# Altium footprint library 元件1.PcbLib: 420 footprints (part 22 of 27)
Each footprint in its own frame and in the unit in brackets; x right, y up, seen from the top. Pads: shape width x height; smd on the part's side, far side on the other; paste and mask are expansions set on the pad; w line width, h text height; cw(c..) or ccw(c..) is an arc to the next point about the centre after c.
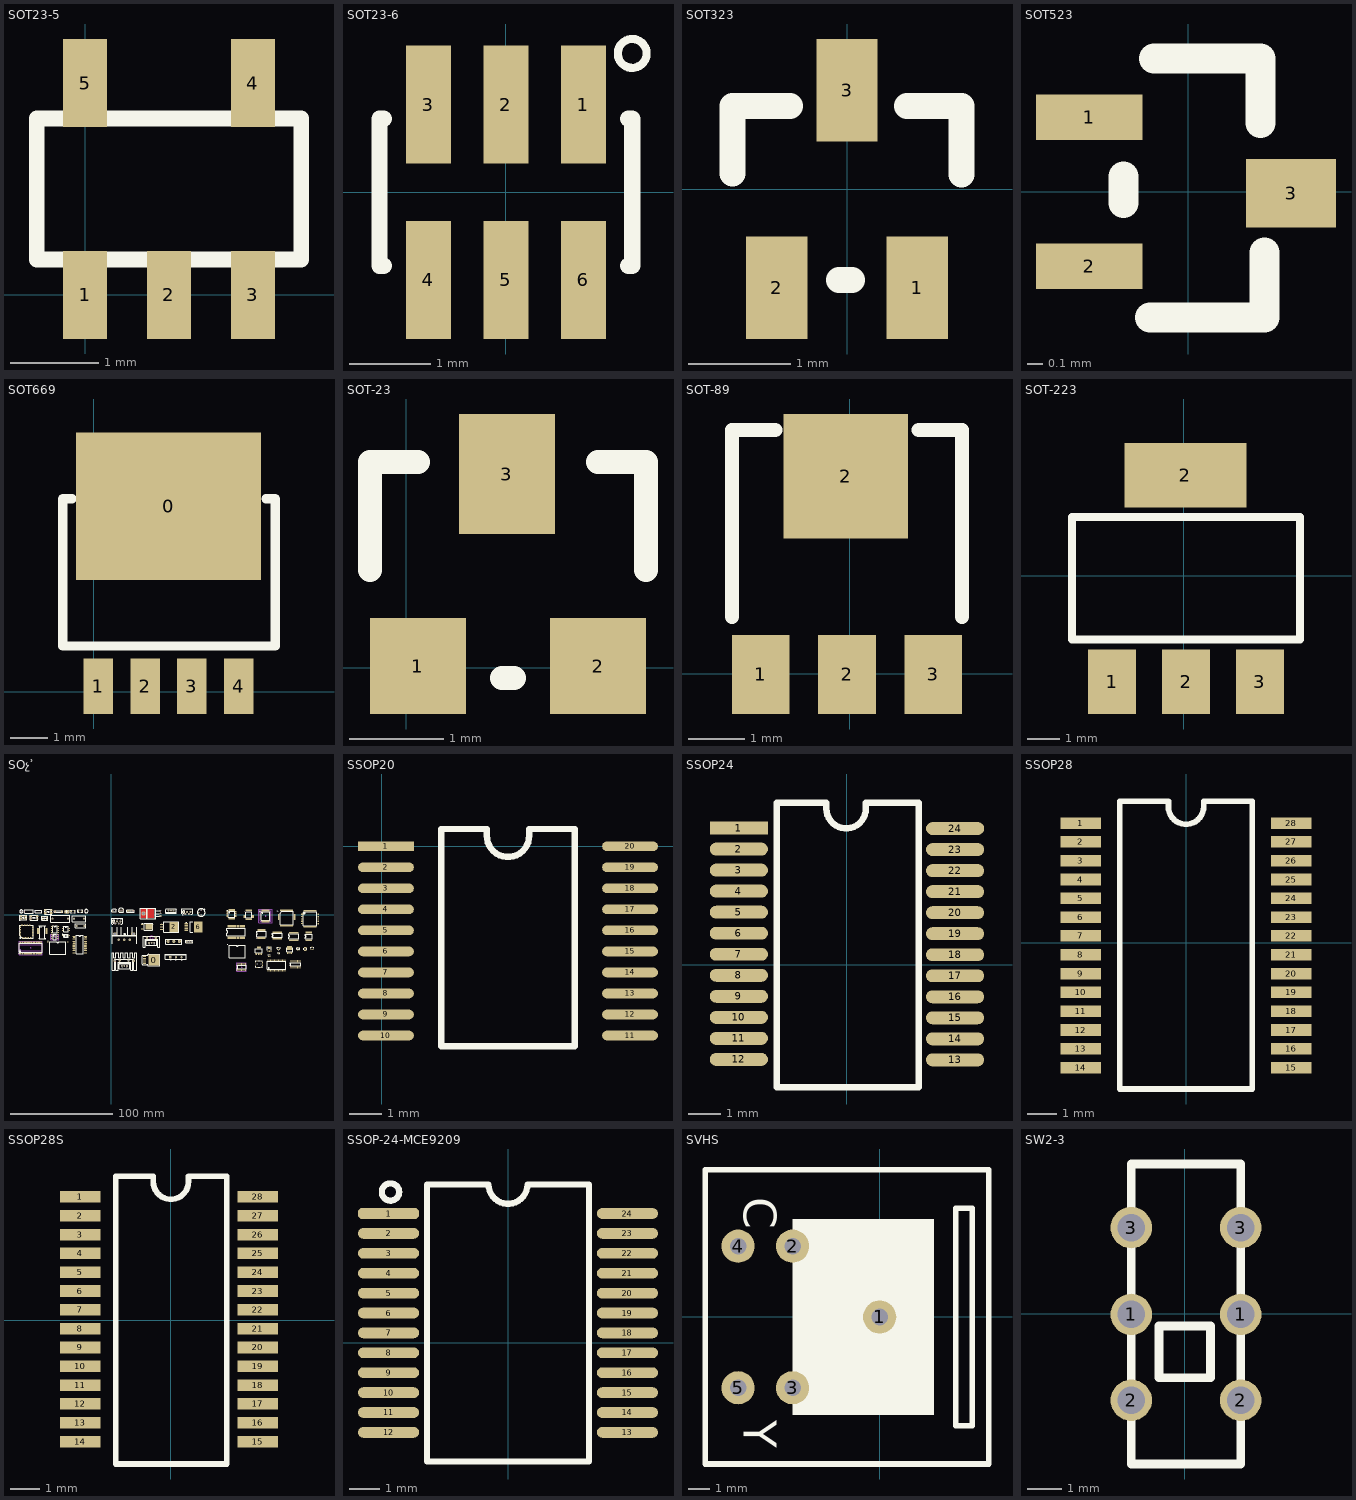
[diagram p21: the footprints below, top view; thin cyan lines are the x and y axes]

## SOT23-5 [mm]
pads (5):
  rect 0.5x1 smd: 1(0,0) 2(0.95,0) 3(1.9,0) 4(1.9,2.4) 5(0,2.4)
Top Overlay:
  lines w0.178: -0.55,0.4 -0.55,2 2.45,2 2.45,0.4 -0.55,0.4
3D body "User Library-SOT23-5.STEP": height 1.09, standoff -0.01, extent -0.5,-0.201 2.399,2.599

## SOT23-6 [mm] "SOT-23/SC-74A; 5 Leads; Body 3.1 x 3 mm, inc. leads (LxW max)"
height 1.45
pads (6):
  rect 0.55x1.45 smd: 1(0.95,1.075) 2(0,1.075) 3(-0.95,1.075) 4(-0.95,-1.075) 5(0,-1.075) 6(0.95,-1.075)
Top Overlay:
  circle w0.1: c1.549,1.702 r0.177
  lines w0.2: -1.5,-0.9 -1.55,-0.9 -1.55,0.9 -1.5,0.9 ; 1.5,-0.9 1.55,-0.9 1.55,0.9 1.5,0.9
3D body "User Library-SOT-23-6.STEP": height 1.08, standoff -0.01, extent -1.397,-1.194 1.397,1.232

## SOT323 [mm]
pads (3):
  rect 0.6x1 smd: 1(0.686,-0.965) 2(-0.686,-0.965) 3(0,0.965)
Top Overlay:
  lines w0.254: -1.118,0.152 -1.118,0.813 -0.559,0.813 ; -0.076,-0.889 0.051,-0.889 ; 0.584,0.813 1.118,0.813 1.118,0.143
3D body "SOT323 (SC70-3)-1.STEP": height 1.1, standoff 0, extent -1.092,-1.097 1.108,1.148

## SOT523 [mil]
pads (3):
  rect 28x12 smd: 1(-25.98,19.58) 2(-25.98,-19.58)
  rect 23.62x18 smd: 3(26.98,-0.46)
Top Overlay:
  lines w7.87: -17,-3 -17,4 ; -10,-33 20,-33 20,-16 ; -9,35 19,35 19,18
3D body "SOT-523.step": height 31.5, standoff 0, extent -32.5,-31.49 30.49,31.5

## SOT669 [mm] "IFPAK"
pads (5):
  rect 5x4 smd: 0(2.032,5.029)
  rect 0.8x1.5 smd: 1(0.127,0.152) 2(1.397,0.152) 3(2.667,0.152) 4(3.937,0.152)
Top Overlay:
  lines w0.254: -0.584,5.232 -0.838,5.232 -0.838,1.245 4.928,1.245 4.928,5.232 4.674,5.232
3D body "User Library-SOT669-CW.step": height 1.55, standoff 0.35, extent -0.418,-0.002 4.482,6.426

## SOT-23 [mil]
pads (3):
  rect 40x40 smd: 1(4.88,0.63) 2(79.88,0.63)
  rect 40x50 smd: 3(41.88,80.63)
Top Overlay:
  lines w10: -15.12,40.63 -15.12,85.63 4.88,85.63 ; 39.88,-4.37 44.88,-4.37 ; 79.88,85.63 99.88,85.63 99.88,40.63
3D body "SOT-23-3.STEP": height 47.24, standoff 0, extent -14.87,-11.02 99.3,99.22

## SOT-89 [mil]
pads (4):
  rect 40x55 smd: 1(-61.82,-0.57) 2(-1.82,-0.57) 3(58.18,-0.57)
  rect 86.61x86.61 smd: 2(-2.76,137.22)
Top Overlay:
  lines w10: -81.82,39.43 -81.82,169.43 -51.82,169.43 ; 48.18,169.43 78.18,169.43 78.18,39.43
3D body "SOT-89.STEP": height 59.45, standoff 0, extent -90.07,-6.45 87.1,162.85

## SOT-223 [mil]
pads (4):
  rect 59x79 smd: 1(-88,-130) 2(2.55,-130) 3(93.1,-130)
  rect 150x79 smd: 2(1.88,123.54)
Top Overlay:
  lines w10: -137.45,-78 142.55,-78 142.55,72 -137.45,72 -137.45,-78
3D body "SOT-223_MP04A.STEP": height 66.93, standoff 0, extent -126.41,-138.72 129.5,135.3

## SOչʾ [mm]
pads (1058):
  round 2.286 hole 1.524: 0(8.179,-44.577) 0(16.815,-44.577) 4(34.696,-22.174) 5(43.332,-22.174)
  rrect10% 11x10.8 smd: 0(41.682,-43.993)
  rect 5x4 smd: 0(173.507,-32.233)
  round 0.508 smd: 0(177.724,3.937) 1(163.525,-10.185)
  oval 0.5x1.45 smd: 1(-88.734,-37.68) 2(-87.934,-37.68) 3(-87.134,-37.68) 4(-86.334,-37.68) 5(-85.534,-37.68) 6(-84.734,-37.68) 7(-83.934,-37.68) 8(-83.134,-37.68) 9(-82.334,-37.68) 10(-81.534,-37.68) 11(-80.734,-37.68) 12(-79.934,-37.68) 13(-79.134,-37.68) 14(-78.334,-37.68) 15(-77.534,-37.68) 16(-76.734,-37.68) 17(-75.934,-37.68) 18(-75.134,-37.68) 19(-74.334,-37.68) 20(-73.534,-37.68) 21(-72.734,-37.68) 22(-71.934,-37.68) 23(-71.134,-37.68) 24(-70.334,-37.68) 25(-69.534,-37.68) 26(-68.734,-37.68) 27(-67.934,-37.68) 28(-67.934,-26.43) 29(-68.734,-26.43) 30(-69.534,-26.43) 31(-70.334,-26.43) 32(-71.134,-26.43) 33(-71.934,-26.43) 34(-72.734,-26.43) 35(-73.534,-26.43) 36(-74.334,-26.43) 37(-75.134,-26.43) 38(-75.934,-26.43) 39(-76.734,-26.43) 40(-77.534,-26.43) 41(-78.334,-26.43) 42(-79.134,-26.43) 43(-79.934,-26.43) 44(-80.734,-26.43) 45(-81.534,-26.43) 46(-82.334,-26.43) 47(-83.134,-26.43) 48(-83.934,-26.43) 49(-84.734,-26.43) 50(-85.534,-26.43) 51(-86.334,-26.43) 52(-87.134,-26.43) 53(-87.934,-26.43) 54(-88.734,-26.43)
  round 1.016 hole 0.635: 1(-88.214,3.302) 2(-86.868,3.302)
  rect 1.9x1.4 smd: 1(-87.847,-3.892) 2(-83.247,-3.892) 3(-83.247,-1.492) 4(-87.847,-1.492)
  rect 1.52x1.52 smd: 1(-85.928,-22.352) 2(-83.388,-22.352) 3(-80.848,-22.352) 4(-78.308,-22.352) 5(-76.352,-19.679) 6(-76.378,-17.139) 7(-76.378,-14.599) 8(-76.352,-12.059) 9(-79.172,-10.135) 10(-81.712,-10.135) 11(-84.252,-10.135) 12(-86.792,-10.135) 13(-88.57,-12.065) 14(-88.57,-14.605) 15(-88.57,-17.145) 16(-88.57,-19.685)
  round 0.8 hole 0.5: 1(-84.785,2.54) 1(-74.473,2.591) 2(-84.785,3.937) 2(-74.473,3.988)
  rect 2.2x1.4 smd: 1(-78.309,-3.993) 2(-72.009,-3.993) 3(-72.009,-1.493) 4(-78.309,-1.493)
  oval 2.25x0.3 smd: 1(-71.004,-11.192) 2(-71.004,-11.692) 3(-71.004,-12.192) 4(-71.004,-12.692) 5(-71.004,-13.192) 6(-71.004,-13.692) 7(-71.004,-14.192) 8(-71.004,-14.692) 9(-71.004,-15.192) 10(-71.004,-15.692) 11(-71.004,-16.192) 12(-71.004,-16.692) 13(-71.004,-17.192) 14(-71.004,-17.692) 15(-71.004,-18.192) 16(-71.004,-18.692) 17(-71.004,-19.192) 18(-71.004,-19.692) 19(-71.004,-20.192) 20(-71.004,-20.692) 21(-71.004,-21.192) 22(-71.004,-21.692) 23(-71.004,-22.192) 24(-71.004,-22.692) 25(-62.904,-22.692) 26(-62.904,-22.192) 27(-62.904,-21.692) 28(-62.904,-21.192) 29(-62.904,-20.692) 30(-62.904,-20.192) 31(-62.904,-19.692) 32(-62.904,-19.192) 33(-62.904,-18.692) 34(-62.904,-18.192) 35(-62.904,-17.692) 36(-62.904,-17.192) 37(-62.904,-16.692) 38(-62.904,-16.192) 39(-62.904,-15.692) 40(-62.904,-15.192) 41(-62.904,-14.692) 42(-62.904,-14.192) 43(-62.904,-13.692) 44(-62.904,-13.192) 45(-62.904,-12.692) 46(-62.904,-12.192) 47(-62.904,-11.692) 48(-62.904,-11.192)
  rect 1.5x1.2 smd: 1(-66.67,-4.402) 1(-44.679,2.121) 2(-62.87,-4.402) 2(-42.062,2.095) 3(-62.87,-2.202) 3(-42.062,4.102) 4(-66.67,-2.202) 4(-44.704,4.077)
  rect 2.5x1.5 smd: 1(-64.159,1.829) 2(-58.343,1.829) 3(-58.343,4.329) 4(-64.159,4.329)
  rect 1.5x0.3 smd: 1(-61.748,-26.47) 1(-58.039,-11.328) 1(112.903,-29.899)
  oval 1.7x0.35 smd: 1(-57.765,-19.163) 2(-57.765,-19.813) 3(-57.765,-20.463) 4(-57.765,-21.113) 5(-57.765,-21.763) 6(-57.765,-22.413) 7(-57.765,-23.063) 8(-57.765,-23.713) 9(-52.065,-23.713) 10(-52.065,-23.063) 11(-52.065,-22.413) 12(-52.065,-21.763) 13(-52.065,-21.113) 14(-52.065,-20.463) 15(-52.065,-19.813) 16(-52.065,-19.163)
  round 2 hole 1: 1(-57.023,-3.708) 1(-36.394,-3.746) 1(-33.744,-10.744) 2(-42.012,-3.683) 2(-26.394,-3.721) 2(-26.098,-10.744)
  rect 1.397x0.6 smd: 1(-54.508,2.87) 2(-48.208,2.87) 3(-48.208,3.77) 4(-54.508,3.77)
  oval 1.4x0.33 smd: 1(-47.421,-19.497) 2(-47.421,-20.147) 3(-47.421,-20.797) 4(-47.421,-21.447) 5(-41.021,-21.447) 6(-41.021,-20.797) 7(-41.021,-20.147) 8(-41.021,-19.497)
  rect 1.2x0.32 smd: 1(-47.269,-11.887)
  rect 1x1.5 smd: 1(-38.894,3.302) 1(-31.782,3.708) 2(-35.731,3.302) 2(-28.619,3.708)
  rect 2.54x0.508 smd: 1(-36.246,-20.295)
  round 1.2 hole 0.6: 1(-25.766,3.645) 2(-22.707,3.632)
  oct 1.905x1.905 hole 1.2: 1(2.235,-6.401) 1(70.409,2.896)
  round 1.27 hole 0.762: 1(4.064,3.886) 2(2.794,5.156) 3(1.524,3.886)
  oval 1.2x2 hole 0.7: 1(9.576,4.013) 2(11.376,4.013) 3(7.776,4.013)
  round 1.7 hole 1: 1(10.211,-49.657) 1(36.728,-27.254) 2(12.751,-49.657) 2(39.268,-27.254) 3(15.291,-49.657) 3(41.808,-27.254)
  round 2.3 hole 1.6: 1(12.624,-24.181) 2(7.174,-24.181) 3(18.074,-24.181)
  round 1.75 hole 1: 1(16.368,3.937) 2(20.868,3.937) 3(18.618,3.937)
  rect 2.2x0.95 smd: 1(30.144,-9.379) 3(30.144,-13.939)
  round 4 hole 3: 1(31.242,1.422)
  rect 3x1.07 smd: 1(32.182,-40.593)
  rect 1.6x1.6 hole 1: 1(47.879,-1.118)
  rect 3.45x1 smd: 1(49.122,-9.195) 2(49.122,-11.735) 3(49.122,-14.275)
  round 3 hole 1.6: 1(55.397,-25.781) 2(60.847,-25.781) 3(66.297,-25.781)
  rect 2.2x2.2 hole 1.5: 1(57.491,-41.275)
  rect 1.778x1.778 hole 1.143: 1(60.706,4.267) 1(73.863,-25.984)
  rect 3.2x1.05 smd: 1(73.101,-8.433) 2(73.101,-10.133) 3(73.101,-11.833) 4(73.101,-13.533) 5(73.101,-15.233)
  rect 1.5x1.5 hole 0.7: 1(87.56,4.864)
  oval 1.65x0.55 smd: 1(112.816,3.308) 2(112.816,2.508) 3(112.816,1.708) 4(112.816,0.908) 5(112.816,0.108) 6(112.816,-0.692) 7(112.816,-1.492) 8(112.816,-2.292) 17(121.22,-2.292) 18(121.22,-1.492) 19(121.22,-0.692) 20(121.22,0.108) 21(121.22,0.908) 22(121.22,1.708) 23(121.22,2.508) 24(121.22,3.308)
  rect 0.508x2.54 smd: 1(112.928,-22.276)
  oval 0.45x2.05 smd mask+0.1: 1(123.012,-53.594) 2(124.282,-53.594) 3(125.552,-53.594) 4(126.822,-53.594) 5(128.092,-53.594) 6(129.362,-53.594) 7(130.632,-53.594) 8(130.632,-47.828) 9(129.362,-47.828) 10(128.092,-47.828) 11(126.822,-47.828) 12(125.552,-47.828) 13(124.282,-47.828) 14(123.012,-47.828)
  rect 1.6x0.3 smd: 1(129.388,2.946) 1(163.037,2.927) 2(129.388,2.446) 2(163.037,2.427) 3(129.388,1.946) 3(163.037,1.927) 4(129.388,1.446) 4(163.037,1.427) 5(129.388,0.946) 5(163.037,0.927) 6(129.388,0.446) 6(163.037,0.427) 7(129.388,-0.054) 7(163.037,-0.073) 8(129.388,-0.554) 8(163.037,-0.573) 9(129.388,-1.054) 9(163.037,-1.073) 10(129.388,-1.554) 10(163.037,-1.573) 11(129.388,-2.054) 11(163.037,-2.073) 12(129.388,-2.554) 12(163.037,-2.573) 13(163.037,-3.073) 14(163.037,-3.573) 15(163.037,-4.073) 16(163.037,-4.573) 17(163.037,-5.073) 18(163.037,-5.573) 19(163.037,-6.073) 20(163.037,-6.573) 21(163.037,-7.073) 22(163.037,-7.573) 23(163.037,-8.073) 24(163.037,-8.573) 25(137.969,-2.554) 25(163.037,-9.073) 26(137.969,-2.054) 27(137.969,-1.554) 28(137.969,-1.054) 29(137.969,-0.554) 30(137.969,-0.054) 31(137.969,0.446) 32(137.969,0.946) 33(137.969,1.446) 34(137.969,1.946) 35(137.969,2.446) 36(137.969,2.946) 51(178.237,-9.073) 52(178.237,-8.573) 53(178.237,-8.073) 54(178.237,-7.573) 55(178.237,-7.073) 56(178.237,-6.573) 57(178.237,-6.073) 58(178.237,-5.573) 59(178.237,-5.073) 60(178.237,-4.573) 61(178.237,-4.073) 62(178.237,-3.573) 63(178.237,-3.073) 64(178.237,-2.573) 65(178.237,-2.073) 66(178.237,-1.573) 67(178.237,-1.073) 68(178.237,-0.573) 69(178.237,-0.073) 70(178.237,0.427) 71(178.237,0.927) 72(178.237,1.427) 73(178.237,1.927) 74(178.237,2.427) 75(178.237,2.927)
  rect 0.8x0.8 smd: 1(140.589,-46.531) 2(140.589,-47.981) 3(140.589,-49.431) 4(146.989,-46.531) 5(146.989,-47.981) 6(146.989,-49.431)
  rect 1.499x2.007 smd: 1(141.275,-38.049) 2(143.575,-38.049) 3(145.875,-38.049)
  oct 0.35x2 smd: 1(142.485,-22.34)
  oval 1.9x0.3 smd: 1(144.639,2.658) 2(144.639,2.158) 3(144.639,1.658) 4(144.639,1.158) 5(144.639,0.658) 6(144.639,0.158) 7(144.639,-0.342) 8(144.639,-0.842) 9(144.639,-1.342) 10(144.639,-1.842) 11(144.639,-2.342) 12(144.639,-2.842) 13(144.639,-3.342) 14(144.639,-3.842) 15(144.639,-4.342) 16(144.639,-4.842) 33(155.539,-4.842) 34(155.539,-4.342) 35(155.539,-3.842) 36(155.539,-3.342) 37(155.539,-2.842) 38(155.539,-2.342) 39(155.539,-1.842) 40(155.539,-1.342) 41(155.539,-0.842) 42(155.539,-0.342) 43(155.539,0.158) 44(155.539,0.658) 45(155.539,1.158) 46(155.539,1.658) 47(155.539,2.158) 48(155.539,2.658)
  rect 1.016x1.397 smd: 1(152.328,-35.473) 2(153.852,-35.473) 3(155.376,-35.473)
  oval 0.6x1.65 smd: 1(152.544,-54.233) 2(153.814,-54.233) 3(155.084,-54.233) 4(156.354,-54.233) 5(157.624,-54.233) 6(158.894,-54.233) 7(160.164,-54.233) 8(161.434,-54.233) 9(162.704,-54.233) 10(163.974,-54.233) 11(165.244,-54.233) 12(166.514,-54.233) 13(167.784,-54.233) 14(169.054,-54.233) 15(169.054,-44.048) 16(167.784,-44.048) 17(166.514,-44.048) 18(165.244,-44.048) 19(163.974,-44.048) 20(162.704,-44.048) 21(161.434,-44.048) 22(160.164,-44.048) 23(158.894,-44.048) 24(157.624,-44.048) 25(156.354,-44.048) 26(155.084,-44.048) 27(153.814,-44.048) 28(152.544,-44.048)
  rect 0.6x1 smd: 1(154.381,-40.411) 2(153.01,-40.411) 3(153.695,-38.481)
  rect 0.4x1.397 smd: 1(157.315,-23.087) 1(173.444,-24.484) 2(157.965,-23.087) 2(174.094,-24.484) 3(158.614,-23.087) 3(174.743,-24.484) 4(159.264,-23.087) 4(175.393,-24.484) 5(159.914,-23.087) 5(176.043,-24.484) 6(160.563,-23.087) 6(176.692,-24.484) 7(161.213,-23.087) 7(177.342,-24.484) 8(161.862,-23.087) 8(177.991,-24.484) 9(162.512,-23.087) 9(178.641,-24.484) 10(163.162,-23.087) 10(179.291,-24.484) 11(163.811,-23.087) 11(179.94,-24.484) 12(164.461,-23.087) 12(180.59,-24.484) 13(165.111,-23.087) 13(181.24,-24.484) 14(165.76,-23.089) 14(181.889,-24.486) 15(165.76,-16.968) 15(181.889,-17.222) 16(165.111,-16.968) 16(181.24,-17.222) 17(164.461,-16.968) 17(180.59,-17.222) 18(163.811,-16.968) 18(179.94,-17.222) 19(163.162,-16.968) 19(179.291,-17.222) 20(162.512,-16.968) 20(178.641,-17.222) 21(161.862,-16.968) 21(177.991,-17.222) 22(161.213,-16.968) 22(177.342,-17.222) 23(160.563,-16.968) 23(176.692,-17.222) 24(159.914,-16.968) 24(176.043,-17.222) 25(159.264,-16.968) 25(175.393,-17.222) 26(158.614,-16.968) 26(174.743,-17.222) 27(157.965,-16.968) 27(174.094,-17.222) 28(157.315,-16.968) 28(173.444,-17.222)
  rect 1.016x1.016 smd: 1(161.82,-33.868) 1(194.536,-33.563) 2(163.725,-33.868) 3(196.441,-33.563)
  rect 0.305x0.711 smd: 1(162.444,-37.998) 2(163.438,-37.998)
  rect 0.8x1.5 smd: 1(171.602,-37.109) 2(172.872,-37.109) 3(174.142,-37.109) 4(175.412,-37.109)
  oval 0.55x2.5 smd: 1(174.93,-51.041) 2(176.2,-51.041) 3(177.47,-51.041) 4(178.74,-51.041) 5(180.01,-51.041) 6(181.28,-51.041) 7(182.55,-51.041) 8(183.82,-51.041) 9(183.82,-44.946) 10(182.55,-44.946) 11(181.28,-44.946) 12(180.01,-44.946) 13(178.74,-44.946) 14(177.47,-44.946) 15(176.2,-44.946) 16(174.93,-44.946)
  rect 0.5x1 smd: 1(181.102,-33.985) 2(182.052,-33.985) 3(183.002,-33.985) 4(183.002,-31.585) 5(181.102,-31.585)
  rect 1.6x0.25 smd: 1(185.522,2.388) 2(185.522,1.988) 3(185.522,1.588) 4(185.522,1.188) 5(185.522,0.788) 6(185.522,0.388) 7(185.522,-0.012) 8(185.522,-0.412) 9(185.522,-0.812) 10(185.522,-1.212) 11(185.522,-1.612) 12(185.522,-2.012) 13(185.522,-2.412) 14(185.522,-2.812) 15(185.522,-3.212) 16(185.522,-3.612) 17(185.522,-4.012) 18(185.522,-4.412) 19(185.522,-4.812) 20(185.522,-5.212) 21(185.522,-5.612) 22(185.522,-6.012) 23(185.522,-6.412) 24(185.522,-6.812) 25(185.522,-7.212) 26(185.522,-7.612) 27(185.522,-8.012) 28(185.522,-8.412) 29(185.522,-8.812) 30(185.522,-9.212) 31(185.522,-9.612) 32(185.522,-10.033) 65(201.32,-10.033) 66(201.32,-9.632) 67(201.32,-9.232) 68(201.32,-8.831) 69(201.32,-8.43) 70(201.32,-8.03) 71(201.32,-7.629) 72(201.32,-7.228) 73(201.32,-6.828) 74(201.32,-6.427) 75(201.32,-6.026) 76(201.32,-5.626) 77(201.32,-5.225) 78(201.32,-4.824) 79(201.32,-4.424) 80(201.32,-4.023) 81(201.32,-3.622) 82(201.32,-3.222) 83(201.32,-2.821) 84(201.32,-2.42) 85(201.32,-2.02) 86(201.32,-1.619) 87(201.32,-1.218) 88(201.32,-0.818) 89(201.32,-0.417) 90(201.32,-0.016) 91(201.32,0.384) 92(201.32,0.785) 93(201.32,1.186) 94(201.32,1.586) 95(201.32,1.987) 96(201.32,2.388)
  rect 0.3x1.727 smd: 1(189.242,-24.724)
  rect 0.55x1.45 smd: 1(189.57,-32.11) 2(188.62,-32.11) 3(187.67,-32.11) 4(187.67,-34.26) 5(188.62,-34.26) 6(189.57,-34.26)
  oval 1.5x0.3 smd: 2(-61.748,-26.97) 2(-58.039,-11.978) 2(112.903,-30.399) 3(-61.748,-27.47) 3(-58.039,-12.628) 3(112.903,-30.899) 4(-61.748,-27.97) 4(-58.039,-13.278) 4(112.903,-31.399) 5(-61.748,-28.47) 5(-58.039,-13.928) 5(112.903,-31.899) 6(-61.748,-28.97) 6(-58.039,-14.578) 6(112.903,-32.399) 7(-61.748,-29.47) 7(-58.039,-15.228) 7(112.903,-32.899) 8(-61.748,-29.97) 8(-58.039,-15.878) 8(112.903,-33.399) 9(-61.748,-30.47) 9(-58.039,-16.528) 9(112.903,-33.899) 10(-61.748,-30.97) 10(-58.039,-17.178) 10(112.903,-34.399) 11(-61.748,-31.47) 11(-51.585,-17.178) 11(112.903,-34.899) 12(-61.748,-31.97) 12(-51.585,-16.528) 12(112.903,-35.399) 13(-61.748,-32.47) 13(-51.585,-15.878) 13(112.903,-35.899) 14(-61.748,-32.97) 14(-51.585,-15.228) 14(112.903,-36.399) 15(-61.748,-33.47) 15(-51.585,-14.578) 15(112.903,-36.899) 16(-61.748,-33.97) 16(-51.585,-13.928) 16(112.903,-37.399) 17(-61.748,-34.47) 17(-51.585,-13.278) 17(112.903,-37.899) 18(-61.748,-34.97) 18(-51.585,-12.628) 18(112.903,-38.399) 19(-61.748,-35.47) 19(-51.585,-11.978) 19(112.903,-38.899) 20(-61.748,-35.97) 20(-51.585,-11.328) 20(112.903,-39.399) 21(-61.748,-36.47) 21(112.903,-39.899) 22(-61.748,-36.97) 22(112.903,-40.399) 23(-61.748,-37.47) 23(112.903,-40.899) 24(-61.748,-37.97) 24(112.903,-41.399) 25(-42.24,-37.97) 25(132.411,-41.399) 26(-42.24,-37.47) 26(132.411,-40.899) 27(-42.24,-36.97) 27(132.411,-40.399) 28(-42.24,-36.47) 28(132.411,-39.899) 29(-42.24,-35.97) 29(132.411,-39.399) 30(-42.24,-35.47) 30(132.411,-38.899) 31(-42.24,-34.97) 31(132.411,-38.399) 32(-42.24,-34.47) 32(132.411,-37.899) 33(-42.24,-33.97) 33(132.411,-37.399) 34(-42.24,-33.47) 34(132.411,-36.899) 35(-42.24,-32.97) 35(132.411,-36.399) 36(-42.24,-32.47) 36(132.411,-35.899) 37(-42.24,-31.97) 37(132.411,-35.399) 38(-42.24,-31.47) 38(132.411,-34.899) 39(-42.24,-30.97) 39(132.411,-34.399) 40(-42.24,-30.47) 40(132.411,-33.899) 41(-42.24,-29.97) 41(132.411,-33.399) 42(-42.24,-29.47) 42(132.411,-32.899) 43(-42.24,-28.97) 43(132.411,-32.399) 44(-42.24,-28.47) 44(132.411,-31.899) 45(-42.24,-27.97) 45(132.411,-31.399) 46(-42.24,-27.47) 46(132.411,-30.899) 47(-42.24,-26.97) 47(132.411,-30.399) 48(-42.24,-26.47) 48(132.411,-29.899)
  oval 1.2x0.32 smd: 2(-47.269,-12.537) 3(-47.269,-13.187) 4(-47.269,-13.837) 5(-47.269,-14.487) 6(-47.269,-15.137) 7(-47.269,-15.787) 8(-40.869,-15.787) 9(-40.869,-15.137) 10(-40.869,-14.487) 11(-40.869,-13.837) 12(-40.869,-13.187) 13(-40.869,-12.537) 14(-40.869,-11.887)
  oval 2.54x0.508 smd: 2(-36.246,-21.095) 3(-36.246,-21.895) 4(-36.246,-22.695) 5(-36.246,-23.495) 6(-36.246,-24.295) 7(-36.246,-25.095) 8(-36.246,-25.895) 9(-36.246,-26.695) 10(-36.246,-27.495) 11(-36.246,-28.296) 12(-36.246,-29.096) 13(-36.246,-29.896) 14(-36.246,-30.696) 15(-36.246,-31.496) 16(-36.246,-32.296) 17(-36.246,-33.096) 18(-36.246,-33.896) 19(-36.246,-34.696) 20(-36.246,-35.496) 21(-36.246,-36.297) 22(-36.246,-37.097) 23(-25.07,-37.097) 24(-25.07,-36.297) 25(-25.07,-35.496) 26(-25.07,-34.696) 27(-25.07,-33.896) 28(-25.07,-33.096) 29(-25.07,-32.296) 30(-25.07,-31.496) 31(-25.07,-30.696) 32(-25.07,-29.896) 33(-25.07,-29.096) 34(-25.07,-28.296) 35(-25.07,-27.495) 36(-25.07,-26.695) 37(-25.07,-25.895) 38(-25.07,-25.095) 39(-25.07,-24.295) 40(-25.07,-23.495) 41(-25.07,-22.695) 42(-25.07,-21.895) 43(-25.07,-21.095) 44(-25.07,-20.295)
  round 1.905 hole 1.2: 2(3.937,-8.433) 2(72.111,0.864) 3(5.613,-6.401) 3(73.787,2.896) 4(7.315,-8.433) 4(75.489,0.864) 5(8.992,-6.401) 5(77.165,2.896)
  rrect50% 3x1.07 smd: 2(32.182,-42.293) 3(32.182,-43.993) 4(32.182,-45.693) 5(32.182,-47.393)
  rect 6.7x5.5 smd: 2(36.694,-11.659)
  round 1.6 hole 1: 2(47.879,1.422) 3(47.879,3.962)
  oct 1.778x1.778 hole 1.143: 2(58.166,4.267) 3(55.626,4.267)
  rect 8.5x10 smd: 2(60.935,-11.735)
  round 2.2 hole 1.5: 2(62.941,-41.275) 3(68.391,-41.275)
  round 1.778 hole 1.143: 2(76.111,-25.984) 3(78.359,-25.984)
  round 1.5 hole 0.7: 2(84.957,2.261) 3(87.56,-0.343)
  oval 0.508x2.54 smd: 2(113.728,-22.276) 3(114.529,-22.276) 4(115.329,-22.276) 5(116.129,-22.276) 6(116.929,-22.276) 7(117.729,-22.276) 8(118.529,-22.276) 9(119.329,-22.276) 10(120.129,-22.276) 11(120.929,-22.276) 12(121.73,-22.276) 13(122.53,-22.276) 14(123.33,-22.276) 15(124.13,-22.276) 16(124.93,-22.276) 17(125.73,-22.276) 18(126.53,-22.276) 19(127.33,-22.276) 20(128.13,-22.276) 21(128.93,-22.276) 22(129.731,-22.276) 23(129.731,-11.1) 24(128.93,-11.1) 25(128.13,-11.1) 26(127.33,-11.1) 27(126.53,-11.1) 28(125.73,-11.1) 29(124.93,-11.1) 30(124.13,-11.1) 31(123.33,-11.1) 32(122.53,-11.1) 33(121.73,-11.1) 34(120.929,-11.1) 35(120.129,-11.1) 36(119.329,-11.1) 37(118.529,-11.1) 38(117.729,-11.1) 39(116.929,-11.1) 40(116.129,-11.1) 41(115.329,-11.1) 42(114.529,-11.1) 43(113.728,-11.1) 44(112.928,-11.1)
  oval 0.35x2 smd: 2(143.135,-22.34) 3(143.785,-22.34) 4(144.435,-22.34) 5(145.085,-22.34) 6(145.735,-22.34) 7(146.385,-22.34) 8(147.035,-22.34) 9(147.685,-22.34) 10(148.335,-22.34) 11(148.985,-22.34) 12(149.635,-22.34) 13(149.635,-14.54) 14(148.985,-14.54) 15(148.335,-14.54) 16(147.685,-14.54) 17(147.035,-14.54) 18(146.385,-14.54) 19(145.735,-14.54) 20(145.085,-14.54) 21(144.435,-14.54) 22(143.785,-14.54) 23(143.135,-14.54) 24(142.485,-14.54)
  rect 3.81x2.007 smd: 2(143.558,-31.609)
  rect 2.2x2.2 smd: 2(153.828,-31.973)
  oval 0.3x1.727 smd: 2(189.892,-24.724) 3(190.542,-24.724) 4(191.192,-24.724) 5(191.842,-24.724) 6(192.492,-24.724) 7(193.142,-24.724) 8(193.792,-24.724) 9(194.442,-24.724) 10(195.092,-24.724) 11(195.092,-17.178) 12(194.442,-17.178) 13(193.792,-17.178) 14(193.142,-17.178) 15(192.492,-17.178) 16(191.842,-17.178) 17(191.192,-17.178) 18(190.542,-17.178) 19(189.892,-17.178) 20(189.242,-17.178)
  rect 1.016x1.27 smd: 2(195.475,-31.531) 3(162.76,-31.836)
  rect 0.457x0.6 smd: 3(162.953,-36.653)
  round 2.286 hole 1.8: 4(3.512,-44.586) 5(21.89,-44.586)
  oval 4x2.5 hole 1.4 slot 2.5 at 0 deg: 4(21.424,-18.431) 5(3.824,-18.431)
  round 0.762 on Top Overlay: 5(-61.494,-25.429) 5(113.157,-28.858)
  rect 8.3x10.45 smd: 6(84.425,-11.811)
  rect 1x0.8 smd: 7(142.039,-51.181) 7(142.039,-44.781) 7(145.539,-51.181) 7(145.539,-44.781)
  oval 0.55x1.65 smd: 9(114.218,-3.694) 10(115.018,-3.694) 11(115.818,-3.694) 12(116.618,-3.694) 13(117.418,-3.694) 14(118.218,-3.694) 15(119.018,-3.694) 16(119.818,-3.694) 25(119.818,4.71) 26(119.018,4.71) 27(118.218,4.71) 28(117.418,4.71) 29(116.618,4.71) 30(115.818,4.71) 31(115.018,4.71) 32(114.218,4.71)
  rect 0.3x1.6 smd: 13(130.941,-4.107) 14(131.441,-4.107) 15(131.941,-4.107) 16(132.441,-4.107) 17(132.941,-4.107) 18(133.441,-4.107) 19(133.941,-4.107) 20(134.441,-4.107) 21(134.941,-4.107) 22(135.441,-4.107) 23(135.941,-4.107) 24(136.441,-4.107) 26(164.637,-10.673) 27(165.137,-10.673) 28(165.637,-10.673) 29(166.137,-10.673) 30(166.637,-10.673) 31(167.137,-10.673) 32(167.637,-10.673) 33(168.137,-10.673) 34(168.637,-10.673) 35(169.137,-10.673) 36(169.637,-10.673) 37(136.436,4.496) 37(170.137,-10.673) 38(135.936,4.496) 38(170.637,-10.673) 39(135.436,4.496) 39(171.137,-10.673) 40(134.936,4.496) 40(171.637,-10.673) 41(134.436,4.496) 41(172.137,-10.673) 42(133.936,4.496) 42(172.637,-10.673) 43(133.436,4.496) 43(173.137,-10.673) 44(132.936,4.496) 44(173.637,-10.673) 45(132.436,4.496) 45(174.137,-10.673) 46(131.936,4.496) 46(174.637,-10.673) 47(131.436,4.496) 47(175.137,-10.673) 48(130.936,4.496) 48(175.637,-10.673) 49(176.137,-10.673) 50(176.637,-10.673) 76(176.637,4.527) 77(176.137,4.527) 78(175.637,4.527) 79(175.137,4.527) 80(174.637,4.527) 81(174.137,4.527) 82(173.637,4.527) 83(173.137,4.527) 84(172.637,4.527) 85(172.137,4.527) 86(171.637,4.527) 87(171.137,4.527) 88(170.637,4.527) 89(170.137,4.527) 90(169.637,4.527) 91(169.137,4.527) 92(168.637,4.527) 93(168.137,4.527) 94(167.637,4.527) 95(167.137,4.527) 96(166.637,4.527) 97(166.137,4.527) 98(165.637,4.527) 99(165.137,4.527) 100(164.637,4.527)
  oval 0.3x1.9 smd: 17(146.339,-6.542) 18(146.839,-6.542) 19(147.339,-6.542) 20(147.839,-6.542) 21(148.339,-6.542) 22(148.839,-6.542) 23(149.339,-6.542) 24(149.839,-6.542) 25(150.339,-6.542) 26(150.839,-6.542) 27(151.339,-6.542) 28(151.839,-6.542) 29(152.339,-6.542) 30(152.839,-6.542) 31(153.339,-6.542) 32(153.839,-6.542) 49(153.839,4.358) 50(153.339,4.358) 51(152.839,4.358) 52(152.339,4.358) 53(151.839,4.358) 54(151.339,4.358) 55(150.839,4.358) 56(150.339,4.358) 57(149.839,4.358) 58(149.339,4.358) 59(148.839,4.358) 60(148.339,4.358) 61(147.839,4.358) 62(147.339,4.358) 63(146.839,4.358) 64(146.339,4.358)
  rect 0.25x1.6 smd: 33(187.223,-11.684) 34(187.623,-11.684) 35(188.023,-11.684) 36(188.423,-11.684) 37(188.823,-11.684) 38(189.223,-11.684) 39(189.623,-11.684) 40(190.023,-11.684) 41(190.423,-11.684) 42(190.823,-11.684) 43(191.223,-11.684) 44(191.623,-11.684) 45(192.023,-11.684) 46(192.423,-11.684) 47(192.823,-11.684) 48(193.223,-11.684) 49(193.623,-11.684) 50(194.023,-11.684) 51(194.423,-11.684) 52(194.823,-11.684) 53(195.223,-11.684) 54(195.623,-11.684) 55(196.023,-11.684) 56(196.423,-11.684) 57(196.823,-11.684) 58(197.223,-11.684) 59(197.623,-11.684) 60(198.023,-11.684) 61(198.423,-11.684) 62(198.823,-11.684) 63(199.223,-11.684) 64(199.623,-11.684) 97(199.623,4.089) 98(199.223,4.089) 99(198.823,4.089) 100(198.423,4.089) 101(198.023,4.089) 102(197.623,4.089) 103(197.223,4.089) 104(196.823,4.089) 105(196.423,4.089) 106(196.023,4.089) 107(195.623,4.089) 108(195.223,4.089) 109(194.823,4.089) 110(194.423,4.089) 111(194.023,4.089) 112(193.623,4.089) 113(193.223,4.089) 114(192.823,4.089) 115(192.423,4.089) 116(192.023,4.089) 117(191.623,4.089) 118(191.223,4.089) 119(190.823,4.089) 120(190.423,4.089) 121(190.023,4.089) 122(189.623,4.089) 123(189.223,4.089) 124(188.823,4.089) 125(188.423,4.089) 126(188.023,4.089) 127(187.623,4.089) 128(187.223,4.089)
  round 0 hole 1.05: ""(142.039,-47.981)
  round 0 hole 0.75: ""(145.539,-47.981)
Top Layer:
  region: 41.808,-3.023 41.808,5.867 28.448,5.867 28.448,-3.023
Top Overlay:
  drawing of 530 lines, arcs and shapes, not listed
  text "1" at 160.858,2.692 h0.76
  text "3" at 41.3,-29.286 h0.76
  text "1" at 36.728,-29.286 h0.76
  text "O" at 8.661,-5.283 h1.02
  text "G" at 5.283,-5.334 h1.02
  text "I" at 8.56,-8.915 h1.02
  text "S" at 2.007,-8.915 h1.02
  text "A" at 1.905,-5.156 h1.02
  text "3" at 14.783,-51.689 h0.76
  text "1" at 10.211,-51.689 h0.76
  text "1" at 57.491,-45.3 h1.5
  text "2" at 62.433,-45.3 h1.5
  text "3" at 67.883,-45.3 h1.5
Keep-Out Layer:
  circle w0.025: c39.273,-22.16 r1.606
Mechanical 13:
  circle w0.1: c-56.265,-19.788 r0.5
  circle w0.1: c-88.584,-34.205 r0.5
  circle w0.1: c146.039,2.958 r0.5
  lines w0.1: -89.484,-35.105 -89.484,-29.005 -67.184,-29.005 -67.184,-35.105 -89.484,-35.105 ; -57.165,-23.988 -52.665,-23.988 -52.665,-18.888 -57.165,-18.888 -57.165,-23.988 ; 145.089,-6.092 155.089,-6.092 155.089,3.908 145.089,3.908 145.089,-6.092
Mechanical 15:
  lines w0.05: -89.734,-38.655 -89.734,-25.455 -66.934,-25.455 -66.934,-38.655 -89.734,-38.655 ; -58.865,-24.238 -50.965,-24.238 -50.965,-18.638 -58.865,-18.638 -58.865,-24.238
  lines w0.051: 126.271,-50.749 127.271,-50.749 ; 126.771,-51.249 126.771,-50.249 ; 122.121,-54.949 131.421,-54.949 131.421,-46.549 122.121,-46.549 122.121,-54.949
  lines w0.1: -78.834,-32.055 -77.834,-32.055 ; -78.334,-32.555 -78.334,-31.555 ; -55.415,-21.438 -54.415,-21.438 ; -54.915,-21.938 -54.915,-20.938 ; 12.124,-24.181 13.124,-24.181 ; 12.624,-24.681 12.624,-23.681 ; 149.589,-1.092 150.589,-1.092 ; 150.089,-1.592 150.089,-0.592 ; 143.439,-7.742 156.739,-7.742 156.739,5.558 143.439,5.558 143.439,-7.742
3D body "SOP14.STEP": height 1.61, standoff 0, extent 122.472,-53.9 131.172,-47.7
3D body "SO28.step": height 2.59, standoff -0.05, extent 151.714,-54.382 169.794,-43.712
3D body "SOT-23-3.STEP": height 1.2, standoff 0, extent 194.034,-33.859 196.934,-31.059
3D body "User Library-SOT23-5.STEP": height 1.09, standoff -0.01, extent 180.602,-34.186 183.501,-31.386
3D body "SOT-523.step": height 0.8, standoff 0, extent 162.141,-38.163 163.741,-36.563
3D body "SOT-23-3.STEP": height 1.2, standoff 0, extent 161.319,-34.163 164.219,-31.363
3D body "SOT-223_MP04A.STEP": height 1.7, standoff 0, extent 140.299,-38.271 146.799,-31.311
3D body "TSSOP28.STEP": height 1.05, standoff 0, extent 172.773,-24.255 182.573,-17.655
3D body "SSOP-24-MCE9209.STEP": height 1.54, standoff 0, extent 141.884,-22.575 150.284,-14.56
3D body "TSOP44.STEP": height 1.23, standoff -0.09, extent 112.231,-22.581 130.441,-10.821
3D body "TQFP100.STEP": height 1.05, standoff -0.1, extent 162.688,-11.1 178.688,4.9
3D body "TQFP48.STEP": height 1.1, standoff 0, extent 129.171,-4.306 138.189,4.712
3D body "SW3dPS-LTC DD-PAK.STEP": height 4.48, standoff 0, extent 32.131,-49.079 46.482,-38.856
3D body "TO247.STEP": height 26.16, standoff -15.75, extent 52.754,-28.973 69.014,-23.673
3D body "User Library-Package T0-220AB With Heatsing Vertical Mount-1.STEP": height 21.07, standoff -4.86, extent 30.768,-33.029 47.768,-22.809
3D body "SW3dPS-TO263-3.STEP": height 4.88, standoff 0.08, extent 48.528,-16.789 64.198,-6.789
3D body "User Library-TO_247.STEP": height 25, standoff -11.05, extent 4.724,-26.517 20.524,-21.207
3D body "TO-18_2N2222.step": height 6.6, standoff -1.79, extent 84.728,-0.539 90.336,5.068
3D body "TO220_3.STEP": height 18.5, standoff -9.9, extent 52.959,1.6 63.359,6.1
3D body "BD135 (TO-126 SOT32) v4.step": height 14.6, standoff -3.35, extent 14.684,3.034 22.484,5.734
3D body "micromsd_n.stp": height 6.84, standoff -3, extent 0.529,2.926 5.049,6.326
3D body "TSOP48.STEP": height 1.2, standoff -0.06, extent -62.044,-38.291 -41.944,-26.191
3D body "TSSOP-8-MCP730.STEP": height 1.22, standoff 0, extent -47.396,-21.974 -40.996,-18.974
3D body "TSSOP16.step": height 1.09, standoff 0, extent -58.029,-23.952 -51.749,-18.952
3D body "TSSOP-48-MCP144.STEP": height 1.2, standoff 0, extent -71.044,-23.241 -62.855,-10.641
3D body "10MM_X2_cap.step": height 9.5, standoff -3, extent -34.887,-12.7 -24.887,-8.7
3D body "X2-15MM.step": height 14, standoff -2.81, extent -58.454,-7.204 -40.454,-0.203
3D body "User Library-GeyerElectronics_KX13.STEP": height 1.31, standoff 0, extent -78.735,-5.283 -71.735,-0.283
3D body "User Library-Crystal TH_.STEP": height 9.28, standoff -1.5, extent -25.964,2.047 -22.514,5.247
3D body "XTAL3215.step": height 0.81, standoff 0, extent -38.906,2.552 -35.706,4.052
3D body "xtal6713.STEP": height 1.3, standoff 0, extent -54.963,2.667 -47.704,3.967
3D body: height 2, standoff 0, extent -73.561,2.286 -67.561,4.278
3D body "CRYSTAL_N.stp": height 9, standoff -3, extent -89.049,1.802 -86.049,4.802
3D body: height 3, standoff 0, extent -83.874,1.739 -75.874,4.727
3D body "XTAL-7050.STEP": height 1, standoff 0, extent -64.816,0.599 -57.816,5.599
3D body "XTAL-3225.STEP": height 0.8, standoff 0, extent -44.932,1.831 -41.732,4.331
3D body "XTAL3215.step": height 0.81, standoff 0, extent -31.794,2.959 -28.594,4.458
3D body "User Library-CRYSTALSMD5X32.STEP": height 1, standoff 0, extent -88.047,-4.293 -83.047,-1.093
3D body "User Library-CRYSTALSMD5X32.STEP": height 1, standoff 0, extent -67.27,-4.902 -62.27,-1.702
3D body "X2-10MM.step": height 12, standoff -2.81, extent -37.894,-6.223 -24.894,-1.222
3D body "ROS-425-319 in CK605 case detailed.step": height 4.57, standoff 0, extent -88.824,-22.631 -76.124,-9.931
3D body "TSSOP-20.STEP": height 1.2, standoff 0, extent -58.088,-17.549 -51.538,-10.949
3D body "TSSOP14.STEP": height 1.2, standoff 0, extent -47.244,-16.393 -40.844,-11.293
3D body "tSOP-54.step": height 1.25, standoff 0, extent -89.459,-37.909 -67.239,-26.149
3D body "TSOP44.STEP": height 1.23, standoff -0.09, extent -36.551,-37.807 -24.791,-19.597
3D body "NPN TO-92 3L (2 54mm).step": height 6.83, standoff -12.7, extent 7.196,2.542 11.956,6.172
3D body "User Library-TO220 L.STEP": height 4.5, standoff -3, extent 28.429,-3.578 48.133,6.422
3D body "User Library-TO220 L.STEP": height 4.5, standoff -3, extent 28.302,-3.755 48.006,6.245
3D body "TO220-5.STEP": height 19.35, standoff -2.26, extent 68.729,0.795 78.889,5.696
3D body "TO220-5.STEP": height 19.35, standoff -2.26, extent 0.555,-8.501 10.715,-3.601
3D body "D-PAK.STEP": height 2.31, standoff 0, extent 30.069,-14.959 39.319,-8.359
3D body "TO263-5.STEP": height 4.78, standoff -0.02, extent 72.175,-16.786 87.845,-6.786
3D body "to-251aa.step": height 9.87, standoff -7.15, extent 72.874,-27.102 79.374,-24.802
3D body "to264.STEP": height 34, standoff -5, extent 52.916,-43.987 72.916,-38.887
3D body "User Library-TQFP32-1.step": height 1.1, standoff 0, extent 112.509,-3.975 121.527,5.042
3D body "TQFP64_1.STEP": height 1, standoff -0.06, extent 144.089,-7.098 156.089,4.902
3D body "User Library-TQFP128.STEP": height 1.1, standoff 0, extent 185.42,-11.827 201.437,4.191
3D body "TSOP48.STEP": height 1.2, standoff -0.06, extent 112.606,-41.72 132.706,-29.62
3D body "TSSOP28.STEP": height 1.05, standoff 0, extent 156.659,-23.238 166.459,-16.638
3D body "SSOP-20.STEP": height 1.79, standoff -0.05, extent 188.462,-24.864 195.762,-16.964
3D body "SOT-89.STEP": height 1.51, standoff 0, extent 151.611,-35.622 156.111,-31.322
3D body "User Library-SOT669-CW.step": height 1.55, standoff 0.35, extent 171.057,-37.264 175.958,-30.836
3D body "SOT323 (SC70-3)-1.STEP": height 1.1, standoff 0, extent 152.603,-40.543 154.803,-38.298
3D body "User Library-SOT-23-6.STEP": height 1.08, standoff -0.01, extent 187.223,-34.379 190.017,-31.953
3D body "SOQ.STEP": height 5, standoff -0.5, extent 140.468,-51.18 147.111,-44.78
3D body "SO-16.step": height 1.45, standoff 0, extent 174.371,-50.933 184.353,-45.028

## SSOP20 [mm]
pads (20):
  rect 1.727x0.3 smd: 1(0.127,0)
  oval 1.727x0.3 smd: 2(0.127,-0.65) 3(0.127,-1.3) 4(0.127,-1.95) 5(0.127,-2.6) 6(0.127,-3.25) 7(0.127,-3.9) 8(0.127,-4.55) 9(0.127,-5.2) 10(0.127,-5.85) 11(7.673,-5.85) 12(7.673,-5.2) 13(7.673,-4.55) 14(7.673,-3.9) 15(7.673,-3.25) 16(7.673,-2.6) 17(7.673,-1.95) 18(7.673,-1.3) 19(7.673,-0.65) 20(7.673,0)
Top Overlay:
  lines w0.2: 1.835,-6.175 1.835,0.533 3.245,0.533 3.245,0.325 ccw(c3.9,0.325) 4.555,0.325 4.555,0.533 5.965,0.533 5.965,-6.175 1.835,-6.175
3D body "SSOP-20.STEP": height 1.79, standoff -0.05, extent -0.013,-6.52 7.887,0.78

## SSOP24 [mm]
pads (24):
  rect 1.8x0.4 smd: 1(-3.326,4.229)
  oval 1.8x0.4 smd: 2(-3.326,3.579) 3(-3.326,2.93) 4(-3.326,2.28) 5(-3.326,1.63) 6(-3.326,0.981) 7(-3.326,0.331) 8(-3.326,-0.319) 9(-3.326,-0.968) 10(-3.326,-1.618) 11(-3.326,-2.267) 12(-3.326,-2.917) 13(3.353,-2.932) 14(3.353,-2.282) 15(3.353,-1.632) 16(3.353,-0.983) 17(3.353,-0.333) 18(3.353,0.316) 19(3.353,0.966) 20(3.353,1.616) 21(3.353,2.265) 22(3.353,2.915) 23(3.353,3.565) 24(3.354,4.214)
Top Overlay:
  lines w0.2: -2.159,-3.785 -2.159,5.01 -0.622,5.01 -0.622,4.827 ccw(c-0.013,4.827) 0.597,4.827 0.597,5.01 2.235,5.01 2.235,-3.785 -2.159,-3.785
3D body "SSOP 24 PIN_.step": height 1.78, standoff -0.21, extent -3.924,-3.654 3.976,4.976

## SSOP28 [mil]
height 93.7
pads (28):
  rect 55x15.75 smd: 1(-142.95,162.5) 2(-142.95,136.92) 3(-142.95,111.34) 4(-142.95,85.77) 5(-142.95,60.19) 6(-142.95,34.61) 7(-142.95,9.04) 8(-142.95,-16.54) 9(-142.95,-42.12) 10(-142.95,-67.69) 11(-142.95,-93.27) 12(-142.95,-118.85) 13(-142.95,-144.42) 14(-143,-170) 15(142.95,-170) 16(142.95,-144.42) 17(142.95,-118.85) 18(142.95,-93.27) 19(142.95,-67.69) 20(142.95,-42.12) 21(142.95,-16.54) 22(142.95,9.04) 23(142.95,34.62) 24(142.95,60.19) 25(142.95,85.77) 26(142.95,111.35) 27(142.95,136.92) 28(142.95,162.5)
Top Overlay:
  lines w7.87: -90,-199 90,-199 90,192 23.99,192 23.99,184.8 cw(c0,184.8) -23.99,184.8 -23.99,192 -90,192 -90,-199
3D body "TSSOP28.STEP": height 41.34, standoff 0, extent -133.91,-196.91 125.93,188.92

## SSOP28S [mil]
pads (28):
  rect 55x15.75 smd: 1(-122.95,167.5) 2(-122.95,141.92) 3(-122.95,116.34) 4(-122.95,90.77) 5(-122.95,65.19) 6(-122.95,39.61) 7(-122.95,14.04) 8(-122.95,-11.54) 9(-122.95,-37.12) 10(-122.95,-62.69) 11(-122.95,-88.27) 12(-122.95,-113.85) 13(-122.95,-139.42) 14(-123,-165) 15(117.95,-165) 16(117.95,-139.42) 17(117.95,-113.85) 18(117.95,-88.27) 19(117.95,-62.69) 20(117.95,-37.12) 21(117.95,-11.54) 22(117.95,14.04) 23(117.95,39.62) 24(117.95,65.19) 25(117.95,90.77) 26(117.95,116.35) 27(117.95,141.92) 28(117.95,167.5)
Top Overlay:
  lines w7.87: -75,-195.5 -75,195.5 -23.99,195.5 -23.99,188.3 ccw(c0,188.3) 23.99,188.3 23.99,195.5 76,195.5 76,-195.5 -75,-195.5
3D body "TSSOP28.STEP": height 41.34, standoff 0, extent -128.87,-192.5 130.97,193.32

## SSOP-24-MCE9209 [mm]
pads (24):
  oct 2x0.35 smd: 1(-3.9,4.225)
  oval 2x0.35 smd: 2(-3.9,3.575) 3(-3.9,2.925) 4(-3.9,2.275) 5(-3.9,1.625) 6(-3.9,0.975) 7(-3.9,0.325) 8(-3.9,-0.325) 9(-3.9,-0.975) 10(-3.9,-1.625) 11(-3.9,-2.275) 12(-3.9,-2.925) 13(3.9,-2.925) 14(3.9,-2.275) 15(3.9,-1.625) 16(3.9,-0.975) 17(3.9,-0.325) 18(3.9,0.325) 19(3.9,0.975) 20(3.9,1.625) 21(3.9,2.275) 22(3.9,2.925) 23(3.9,3.575) 24(3.9,4.225)
Top Overlay:
  circle w0.203: c-3.839,4.928 r0.283
  lines w0.203: -2.65,-3.875 -2.65,5.175 -0.635,5.175 ccw(c0,5.175) 0.635,5.175 2.65,5.175 2.65,-3.875 -2.65,-3.875
3D body "SSOP-24-MCE9209.STEP": height 1.54, standoff 0, extent -4.135,-3.574 3.881,4.826

## SVHS [mil] "S VIDEO PORT"
pads (5):
  round 60 hole 30: 1(0,0) 2(-157.48,127.95) 3(-157.48,-127.95) 4(-255.91,127.95) 5(-255.91,-127.95)
Top Overlay:
  rectangle: -157.48,-177.17 98.43,177.17
  lines w10: -314.96,-265.75 196.85,-265.75 196.85,265.75 -314.96,265.75 -314.96,-265.75 ; 137.8,-196.85 137.8,196.85 167.32,196.85 167.32,-196.85 137.8,-196.85
  text "C" at -246.06,216.54 h60
  text "Y" at -246.06,-187.01 h60
3D body "SVHS.STEP": height 767.72, standoff -59.06, extent -314.96,-255.9 118.11,255.91

## SW2-3 [mm]
pads (6):
  round 1.2 hole 0.8: 1(-1.549,-0.025) 1(1.626,-0.025) 2(-1.549,-2.515) 2(1.626,-2.515) 3(-1.549,2.489) 3(1.626,2.489)
Top Overlay:
  lines w0.254: -1.549,-4.363 1.626,-4.363 1.626,4.337 -1.549,4.337 -1.549,-4.363 ; -0.748,-1.863 0.752,-1.863 0.752,-0.363 -0.748,-0.363 -0.748,-1.863
3D body "CK_Slide (2).STEP": height 5.5, standoff -2.95, extent -1.749,-4.551 1.851,4.449